# Altium footprint library Passive Pad Lib.PcbLib: 110 footprints (part 1 of 7)
Each footprint in its own frame and in the unit in brackets; x right, y up, seen from the top. Pads: shape width x height; smd on the part's side, far side on the other; paste and mask are expansions set on the pad; w line width, h text height; cw(c..) or ccw(c..) is an arc to the next point about the centre after c.
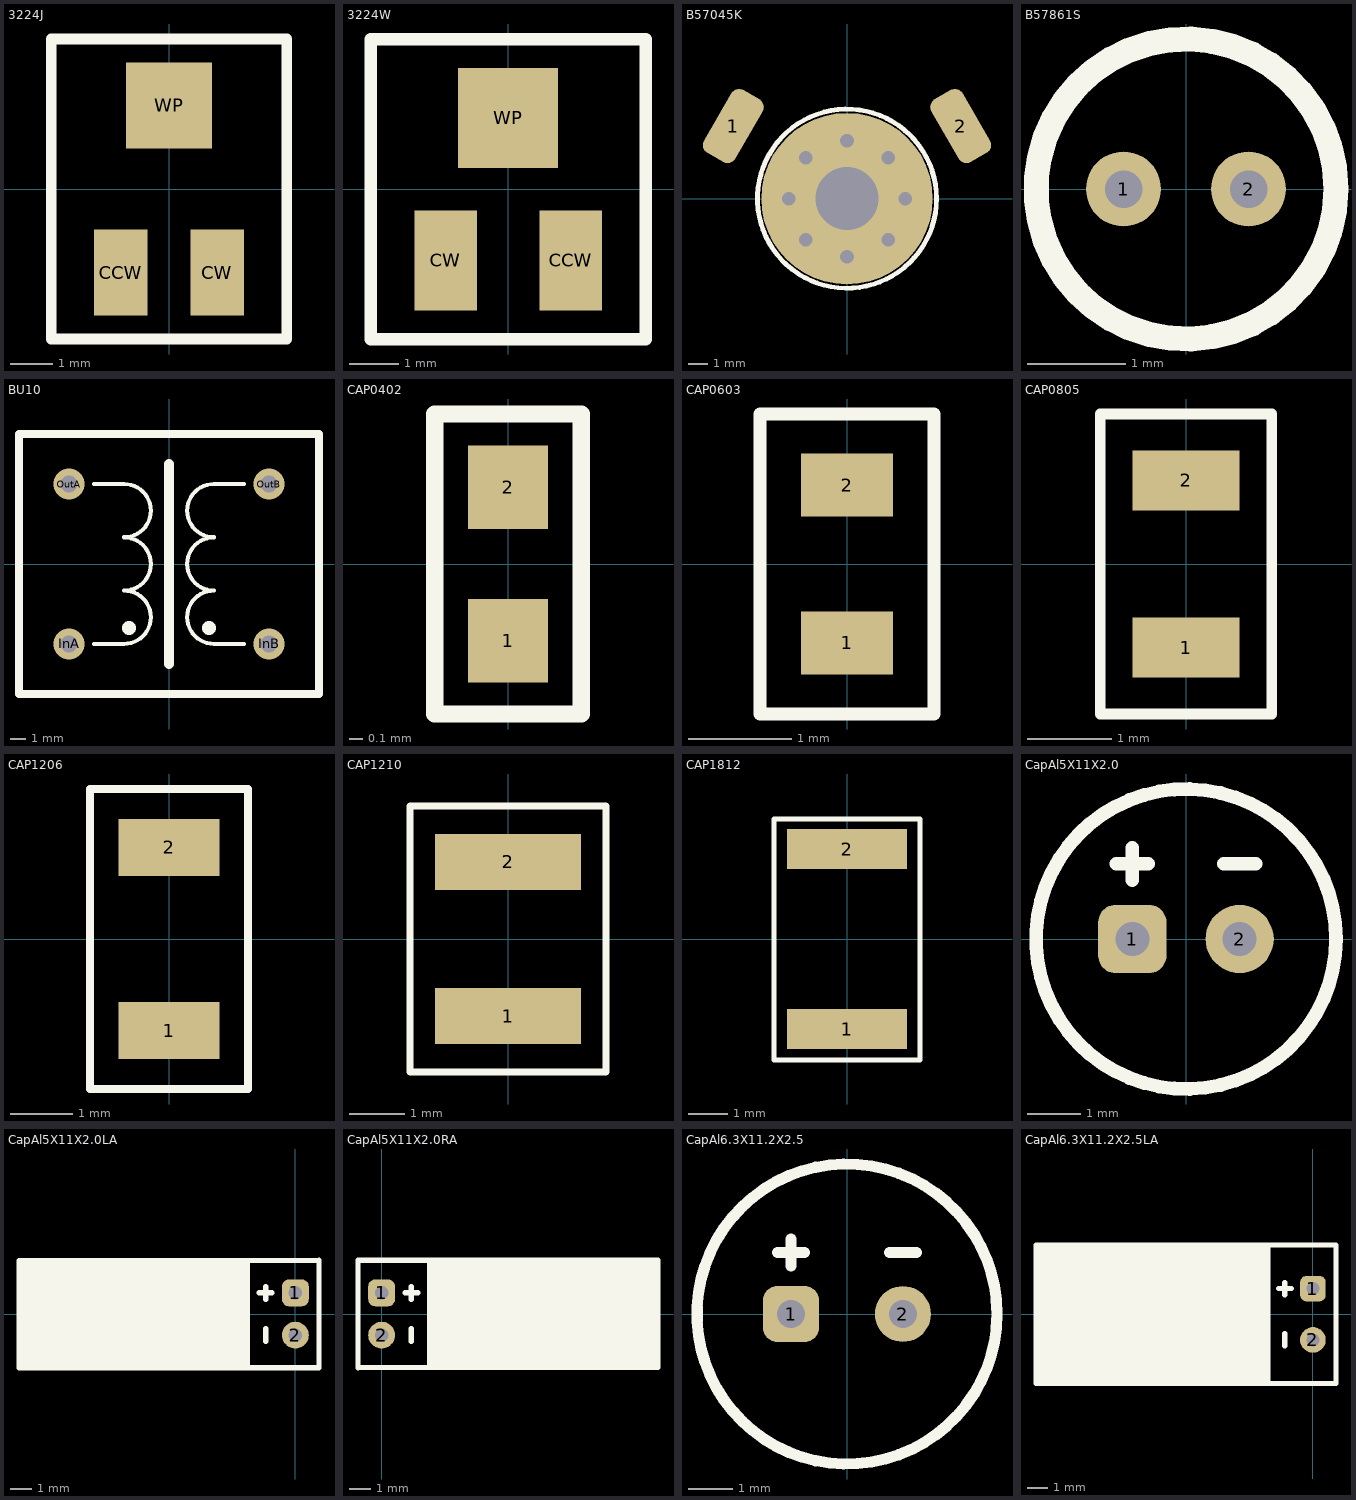
[diagram p0: the footprints below, top view; thin cyan lines are the x and y axes]

## 3224J [mil] "3224J Trim Potentiometer"
pads (3):
  rect 50x80 smd: CCW(-45,-78) CW(45,-78)
  rect 80x80 smd: WP(0,78)
Top Overlay:
  lines w10: -110,-140 -110,140 110,140 110,-140 -110,-140
3D body "3224J(Bourns).STEP": height 145.25, standoff -1, extent -97,-97.5 93,97.5

## 3224W [mil] "3224W Trim Potentiometer"
pads (3):
  rect 50x80 smd: CCW(50,-57) CW(-50,-57)
  rect 80x80 smd: WP(0,57)
Top Overlay:
  lines w10: -110,-120 110,-120 110,120 -110,120 -110,-120
3D body "3224W(Bourns).STEP": height 207, standoff -1, extent -95,-88.19 95,66.85

## B57045K [mil] "Thermistors NTC (Stud mount M3X7mm Size:10X15mm)"
pads (11):
  round 0 hole 28: 0(-120.08,0) 0(-85,-85) 0(-85,85) 0(0,-120.08) 0(0,120.08) 0(85,-85) 0(85,85) 0(120.08,0)
  rrect50% 150x75 smd rot 60: 1(-235,150)
  rrect50% 150x75 smd rot 120: 2(235,150)
  round 354.33 hole 129.92: ""(0,0)
Top Overlay:
  circle w10: c0,0 r185.04
3D body "B57045K(TDK).STEP": height 671.29, standoff -273.59, extent -181.84,-157.48 181.85,157.48

## B57861S [mil] "Miniature thermistors NTC with bendable wires  Size:2.5X6.5mm)"
pads (2):
  round 30 hole 15: 1(-25,0) 2(25,0)
Top Overlay:
  circle w10: c0,0 r60
3D body "B57861S(TDK).STEP": height 505.91, standoff -64.96, extent -47.44,-47.44 47.44,47.44

## BU10 [mm] "COMMON MODE POWER LINE CHOKE"
height 22.5
pads (4):
  round 2 hole 1.1: InA(-6.35,-5.08) InB(6.35,-5.08) OutA(-6.35,5.08) OutB(6.35,5.08)
Top Overlay:
  circle w0.75: c2.54,-4.064 r0.064
  circle w0.75: c-2.54,-4.064 r0.064
  lines w0.25: -4.75,-5.08 -2.845,-5.08 ; -4.75,5.08 -2.845,5.08 cw(c-2.845,3.391) -2.845,1.702 ; -2.845,-5.067 ccw(c-2.845,-3.378) -2.845,-1.689 ccw(c-2.845,0) -2.845,1.689 ; 2.845,-5.08 4.75,-5.08 ; 2.845,-5.067 cw(c2.845,-3.378) 2.845,-1.689 cw(c2.845,0) 2.845,1.689 ; 2.845,1.702 cw(c2.845,3.391) 2.845,5.08 4.75,5.08
  lines w0.5: -9.525,-8.255 -9.525,8.255 9.525,8.255 9.525,-8.255 -9.525,-8.255
  lines w0.635: 0,-6.35 0,6.35
3D body "BU10(Coilcraft).step": height 22.5, standoff -4.5, extent -9.47,-8.05 9.47,8.05

## CAP0402 [mil] "0402 Reflow Pad"
pads (2):
  rect 23x24 smd: 1(0,-22) 2(0,22)
Top Overlay:
  lines w5: -21,-43 21,-43 21,43 -21,43 -21,-43
3D body "SMD Capacitor 0402.STEP": height 19.76, standoff 0, extent -9.84,-19.69 9.84,19.69

## CAP0603 [mil] "0603 Reflow Pad"
pads (2):
  rect 35x24 smd: 1(0,-30) 2(0,30)
Top Overlay:
  lines w5: -33,-57 -33,57 33,57 33,-57 -33,-57
3D body "SMD Capacitor 0603.STEP": height 35.51, standoff 0, extent -15.75,-31.49 15.75,31.51

## CAP0805 [mil] "0805 Reflow Pad"
pads (2):
  rect 50x28 smd: 1(0,-39) 2(0,39)
Top Overlay:
  lines w5: -40,-70 40,-70 40,70 -40,70 -40,-70
3D body "SMD Capacitor 0805.STEP": height 49.29, standoff 0, extent -24.61,-39.37 24.6,39.37

## CAP1206 [mil] "1206 Reflow Pad"
pads (2):
  rect 64x36 smd: 1(0,-58) 2(0,58)
Top Overlay:
  lines w5: -50,-95 -50,95 50,95 50,-95 -50,-95
3D body "SMD Capacitor 1206.STEP": height 63.07, standoff 0, extent -31.5,-61.02 31.49,61.03

## CAP1210 [mil] "1210 Reflow Pad"
pads (2):
  rect 104x40 smd: 1(0,-55) 2(0,55)
Top Overlay:
  lines w5: -70,-95 70,-95 70,95 -70,95 -70,-95
3D body "SMD Capacitor 1210.STEP": height 98.5, standoff 0, extent -51.18,-61.02 51.18,61.03

## CAP1812 [mil] "1218 Reflow Pad"
pads (2):
  rect 120x40 smd: 1(0,-90) 2(0,90)
Top Overlay:
  lines w5: -73,-121 73,-121 73,120 -73,120 -73,-121
3D body "SMD Capacitor 1812.step": height 63.07, standoff 0, extent -62.99,-88.57 62.99,88.59

## CapAl5X11X2.0 [mm] "Aluminum Electrolytic Capacitors (Size:5X11X2.0mm,Straight)"
pads (2):
  rrect50% 1.27x1.27 hole 0.635: 1(-1,0)
  round 1.27 hole 0.635: 2(1,0)
Top Overlay:
  circle w0.254: c0,0 r2.794
  lines w0.254: -1.3,1.4 -0.7,1.4 ; -1,1.1 -1,1.7 ; 0.7,1.4 1.3,1.4
3D body "THD Capacitor Polar 5x11x2mm.STEP": height 11.4, standoff -3.4, extent -2.525,-2.525 2.525,2.525

## CapAl5X11X2.0LA [mm] "Aluminum Electrolytic Capacitors (Size:5X11X2.0mm, Angled Left)"
pads (2):
  rrect50% 1.27x1.27 hole 0.635: 1(0,1)
  round 1.27 hole 0.635: 2(0,-1)
Top Overlay:
  region: -2.134,-2.54 -2.134,2.54 -13.056,2.54 -13.056,-2.54
  lines w0.254: -13.056,-2.54 1.118,-2.54 ; -13.056,-2.515 -13.056,2.515 1.118,2.54 1.118,-2.54 ; -1.7,1 -1.1,1 ; -1.4,-1.3 -1.4,-0.7 ; -1.4,0.7 -1.4,1.3 ; 1.118,-2.515 1.118,-2.54
3D body "THD Capacitor Polar 5x11x2mm RL.STEP": height 5.19, standoff -2.83, extent -13.05,-2.525 0.224,2.525

## CapAl5X11X2.0RA [mm] "Aluminum Electrolytic Capacitors (Size:5X11X2.0mm, Angled Right)"
pads (2):
  rrect50% 1.27x1.27 hole 0.635: 1(0,1)
  round 1.27 hole 0.635: 2(0,-1)
Top Overlay:
  region: 2.134,2.54 2.134,-2.54 13.056,-2.54 13.056,2.54
  lines w0.254: -1.118,2.515 -1.118,2.54 ; 1.1,1 1.7,1 ; 1.4,-1.3 1.4,-0.7 ; 1.4,0.7 1.4,1.3 ; 13.056,2.515 13.056,-2.515 -1.118,-2.54 -1.118,2.54 ; 13.056,2.54 -1.118,2.54
3D body "THD Capacitor Polar 5x11x2mm RA.STEP": height 5.19, standoff -2.83, extent -0.224,-2.525 13.05,2.525

## CapAl6.3X11.2X2.5 [mil] "Aluminum Electrolytic Capacitors (Size:6.3X11.2X2.5mm,Straight)"
pads (2):
  rrect50% 50x50 hole 25: 1(-50,0)
  round 50 hole 25: 2(50,0)
Top Overlay:
  circle w10: c0,0 r134
  lines w10: -62,55 -38,55 ; -50,43 -50,67 ; 38,55 62,55
3D body "THD Capacitor Polar 6.3x11.2x2.5mm.STEP": height 456.63, standoff -133.81, extent -125.01,-125.01 125.02,125.02

## CapAl6.3X11.2X2.5LA [mil] "Aluminum Electrolytic Capacitors (Size:6.3X11.2X2.5mm, Angled Left)"
pads (2):
  rrect50% 50x50 hole 25: 1(0,50)
  round 50 hole 25: 2(0,-50)
Top Overlay:
  region: -82.5,-133.5 -82.5,134.5 -539.5,134.5 -539.5,-133.5
  lines w10: -67,50 -42,50 ; -55,-62 -55,-38 ; -55,38 -55,62 ; -540,-135 -540,135 45,135 45,-135 -540,-135
3D body "THD Capacitor Polar 6.3x11.2x2.5mm LA.STEP": height 255.02, standoff -106.22, extent -539.63,-125.01 10.5,125.02